# Altium footprint library alex_footprint.PcbLib: 262 footprints (part 9 of 17)
Each footprint in its own frame and in the unit in brackets; x right, y up, seen from the top. Pads: shape width x height; smd on the part's side, far side on the other; paste and mask are expansions set on the pad; w line width, h text height; cw(c..) or ccw(c..) is an arc to the next point about the centre after c.
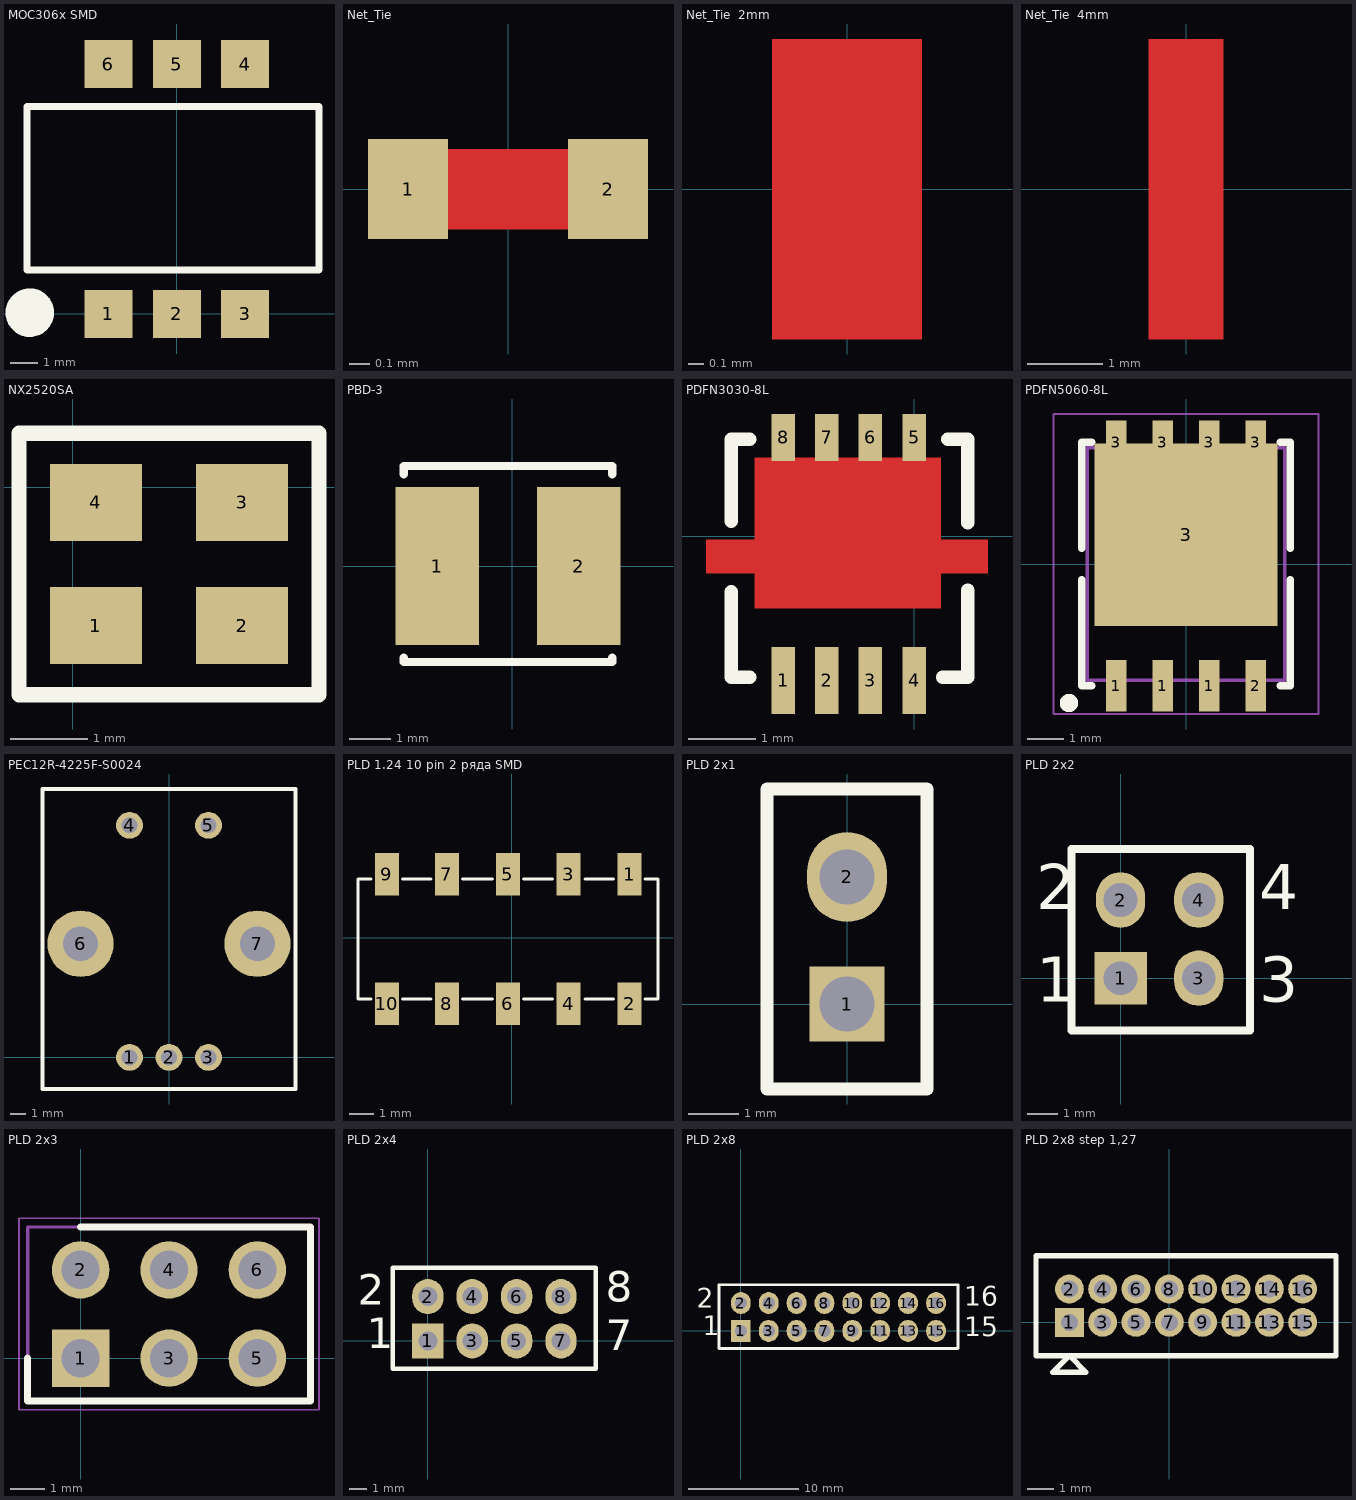
[diagram p8: the footprints below, top view; thin cyan lines are the x and y axes]

## MOC306x SMD [mm]
pads (6):
  rect 1.78x1.78 smd: 1(-2.54,0) 2(0,0) 3(2.54,0) 4(2.54,9.27) 5(0,9.27) 6(-2.54,9.27)
Top Overlay:
  circle w1: c-5.45,0.05 r0.4
  lines w0.254: -5.55,1.625 5.275,1.625 5.275,7.7 -5.55,7.7 -5.55,1.625

## Net_Tie [mm]
pads (2):
  rect 0.4x0.5 smd: 1(-0.5,0) 2(0.5,0)
Top Layer:
  region: -0.5,0.2 0.5,0.2 0.5,-0.2 -0.5,-0.2

## Net_Tie  2mm [mm]
Top Layer:
  region: -0.5,1 0.5,1 0.5,-1 -0.5,-1

## Net_Tie  4mm [mm]
Top Layer:
  region: -0.5,2 0.5,2 0.5,-2 -0.5,-2

## NX2520SA [mm]
pads (4):
  rect 1.2x1 smd: 1(0.3,-1.8) 2(2.2,-1.8) 3(2.2,-0.2) 4(0.3,-0.2)
Top Overlay:
  lines w0.2: -0.7,-2.7 3.2,-2.7 3.2,0.7 -0.7,0.7 -0.7,-2.7
Mechanical 7:
  text ".Designator" at -2.1,1.6 h1.5

## PBD-3 [mm]
pads (2):
  rect 2x3.8 smd: 1(-1.8,0) 2(1.6,0)
Top Overlay:
  lines w0.2: -2.6,-2.2 -2.6,-2.3 2.4,-2.3 2.4,-2.2 ; -2.6,2.2 -2.6,2.4 2.4,2.4 2.4,2.2

## PDFN3030-8L [mm]
pads (8):
  rect 0.35x1 smd: 1(-1.95,-2.15) 2(-1.3,-2.15) 3(-0.65,-2.15) 4(0,-2.15)
  rect 0.35x0.7 smd: 5(0,1.475) 6(-0.65,1.475) 7(-1.3,1.475) 8(-1.95,1.475)
Top Layer:
  region: -2.375,1.175 0.4,1.175 0.4,-1.075 -2.375,-1.075
  region: 1.1,-0.05 0.9,-0.05 -3.1,-0.05 -3.1,-0.55 1.1,-0.55
Top Overlay:
  lines w0.2: -2.725,-0.825 -2.725,-2.1 -2.45,-2.1 ; -2.725,0.225 -2.725,1.45 -2.45,1.45 ; 0.425,-2.1 0.8,-2.1 0.8,-0.8 ; 0.5,1.45 0.8,1.45 0.8,0.2
Top Solder:
  region: -3.2,0.1 -2.5,0.1 -2.5,1.3 0.5,1.3 0.5,0.1 1.2,0.1 1.2,-0.7 0.6,-0.7 0.6,-1.2 -2.5,-1.2 -2.5,-0.7 -3.2,-0.7

## PDFN5060-8L [mm]
height 1.2
pads (9):
  rect 0.55x1.4 smd: 1(-1.905,-3.325) 1(-0.635,-3.325) 1(0.635,-3.325) 2(1.905,-3.325)
  rect 0.55x1.2 smd: 3(-1.905,3.325) 3(-0.635,3.325) 3(0.635,3.325) 3(1.905,3.325)
  rect 5x5 smd mask+0.25: 3(0,0.8)
Top Overlay:
  circle w0.25: c-3.2,-3.8 r0.125
  lines w0.2: -2.85,-0.425 -2.85,-3.325 -2.58,-3.325 ; -2.85,0.425 -2.85,3.325 -2.58,3.325 ; 2.58,-3.325 2.85,-3.325 2.85,-0.425 ; 2.58,3.325 2.85,3.325 2.85,0.425
Mechanical 13:
  circle w0.1: c-1.8,2.275 r0.5
  lines w0.1: -2.7,-3.175 -2.7,3.175 2.7,3.175 2.7,-3.175 -2.7,-3.175
Mechanical 15:
  lines w0.05: -3.625,-4.1 -3.625,4.1 3.625,4.1 3.625,-4.1 -3.625,-4.1
  lines w0.1: -0.5,0 0.5,0 ; 0,-0.5 0,0.5
3D body: height 1.2, standoff 0.1, extent -2.7,-3.175 2.7,3.175

## PEC12R-4225F-S0024 [mm]
pads (7):
  round 1.7 hole 1 unplated: 1(-2.5,0) 2(0,0) 3(2.5,0) 4(-2.5,14.7) 5(2.5,14.7)
  round 4.2 hole 2.2 unplated: 6(-5.6,7.2) 7(5.6,7.2)
Top Overlay:
  lines w0.254: -8,-2 -8,17 ; -8,-2 -8,17 ; -8,-2 -6,-2 -8,-2 ; -8,17 8,17 ; -8,17 8,17 ; 8,-2 8,17 ; 8,-2 8,17 ; 8,-2 -7,-2 8,-2

## PLD 1.24 10 pin 2 ряда SMD [mm]
pads (10):
  rect 1x1.78 smd mask+0.051: 1(4.91,2.65) 2(4.91,-2.75) 3(2.37,2.65) 4(2.37,-2.75) 5(-0.17,2.65) 6(-0.17,-2.75) 7(-2.71,2.65) 8(-2.71,-2.75) 9(-5.21,2.65) 10(-5.21,-2.75)
Top Overlay:
  lines w0.127: -5.86,-2.55 -6.41,-2.55 -6.41,2.45 -5.86,2.45 ; -4.56,-2.55 -3.36,-2.55 ; -4.56,2.45 -3.36,2.45 ; -2.06,-2.55 -0.81,-2.55 ; -2.06,2.45 -0.81,2.45 ; 0.49,-2.55 1.69,-2.55 ; 0.49,2.45 1.69,2.45 ; 3.04,-2.55 4.24,-2.55 ; 3.04,2.45 4.24,2.45 ; 5.54,-2.55 6.09,-2.55 6.09,2.45 5.54,2.45

## PLD 2x1 [mm]
height 10
pads (2):
  rect 1.5x1.5 hole 1.1: 1(0,0)
  oval 1.6x1.8 hole 1.1: 2(0,2.54)
Top Overlay:
  lines w0.254: -1.6,-1.7 -1.6,4.3 1.6,4.3 1.6,-1.7 -1.6,-1.7
3D body "DS1021-1_2SF11-B.stp": height 8.61, standoff -5.08, extent -1.122,-1.24 1.418,3.84

## PLD 2x2 [mm]
height 10
pads (4):
  rect 1.7x1.7 hole 1.1 mask+0.25: 1(0,0)
  oval 1.6x1.8 hole 1.1 mask+0.25: 2(0,2.54) 3(2.54,0) 4(2.54,2.54)
Top Overlay:
  lines w0.254: -1.6,-1.7 -1.6,4.2 4.2,4.2 4.2,-1.7 -1.6,-1.7
  text "4" at 4.5,1.75 h2.5
  text "3" at 4.5,-1.25 h2.5
  text "2" at -2.75,1.75 h2.5
  text "1" at -2.75,-1.25 h2.5
3D body "826656-2.stp": height 8.6, standoff -3.2, extent -1.09,-1.277 3.99,3.723

## PLD 2x3 [mm]
pads (6):
  rect 1.65x1.65 hole 1.1: 1(0,0)
  round 1.65 hole 1.1: 2(0,2.54) 3(2.54,0) 4(2.54,2.54) 5(5.08,0) 6(5.08,2.54)
Top Overlay:
  lines w0.2: -1.52,0 -1.52,-1.23 6.6,-1.23 6.6,3.77 0,3.77
Mechanical 13:
  lines w0.1: -1.52,-1.23 6.6,-1.23 6.6,3.77 -1.52,3.77 -1.52,-1.23
Mechanical 15:
  lines w0.05: -1.77,-1.48 6.85,-1.48 6.85,4.02 -1.77,4.02 -1.77,-1.48
3D body "DS1021-2_3SF1-1.stp": height 8.7, standoff -2.9, extent -1.295,-0.95 6.325,4.05

## PLD 2x4 [mm]
pads (8):
  rect 1.8x2 hole 1.1: 1(0,0)
  oval 1.8x2 hole 1.1: 2(0,2.54) 3(2.54,0) 4(2.54,2.54) 5(5.08,0) 6(5.08,2.54) 7(7.62,0) 8(7.62,2.54)
Top Overlay:
  lines w0.254: -2,-1.6 2.75,-1.6 9.62,-1.6 9.62,-0.175 9.62,2.675 9.62,4.2 2.75,4.2 -2,4.2 -2,-1.5
  text "7" at 10.173,-1.1 h3
  text "8" at 10.17,1.683 h3
  text "2" at -4,1.5 h3
  text "1" at -3.497,-1 h3
Mechanical 7:
  text ".Designator" at 4.1,4.9 h1.5

## PLD 2x8 [mm]
pads (16):
  rect 1.8x2 hole 1.1: 1(0,0)
  oval 1.8x2 hole 1.1: 2(0,2.54) 3(2.54,0) 4(2.54,2.54) 5(5.08,0) 6(5.08,2.54) 7(7.62,0) 8(7.62,2.54) 9(10.16,0) 10(10.16,2.54) 11(12.7,0) 12(12.7,2.54) 13(15.24,0) 14(15.24,2.54) 15(17.8,0) 16(17.8,2.54)
Top Overlay:
  lines w0.254: -2,-1.6 2.75,-1.6 12.25,-1.6 19.8,-1.6 19.8,-0.175 19.8,2.675 19.8,4.2 ; -2,-1.5 -2,4.2 2.75,4.2 12.25,4.2 19.8,4.2 ; 19.8,4.2 19.8,4.2
  text "2" at -4,1.5 h3
  text "1" at -3.497,-1 h3
  text "15" at 20.353,-1.067 h3
  text "16" at 20.353,1.683 h3
Mechanical 7:
  text ".Designator" at 4.1,4.9 h1.5

## PLD 2x8 step 1,27 [mm]
pads (16):
  rect 1.1x1.1 hole 0.65 unplated mask+0.25: 1(-3.81,0)
  round 1.1 hole 0.65 unplated mask+0.25: 2(-3.81,1.27) 3(-2.54,0) 4(-2.54,1.27) 5(-1.27,0) 6(-1.27,1.27) 7(0,0) 8(0,1.27) 9(1.27,0) 10(1.27,1.27) 11(2.54,0) 12(2.54,1.27) 13(3.81,0) 14(3.81,1.27) 15(5.08,0) 16(5.08,1.27)
Top Overlay:
  lines w0.2: -5.08,-1.27 6.35,-1.27 6.35,2.54 -5.08,2.54 -5.08,-1.27 ; -4.445,-1.905 -3.81,-1.27 -3.175,-1.905 -4.445,-1.905
Top Solder:
  rectangle: -3.81,0 5.08,1.27
Bottom Solder:
  rectangle: -3.81,0 5.08,1.27